# Altium footprint library 2.81-BGA132-152 NAND FLASH封装.PcbLib: 3 footprints
Each footprint in its own frame and in the unit in brackets; x right, y up, seen from the top. Pads: shape width x height; smd on the part's side, far side on the other; paste and mask are expansions set on the pad; w line width, h text height; cw(c..) or ccw(c..) is an arc to the next point about the centre after c.
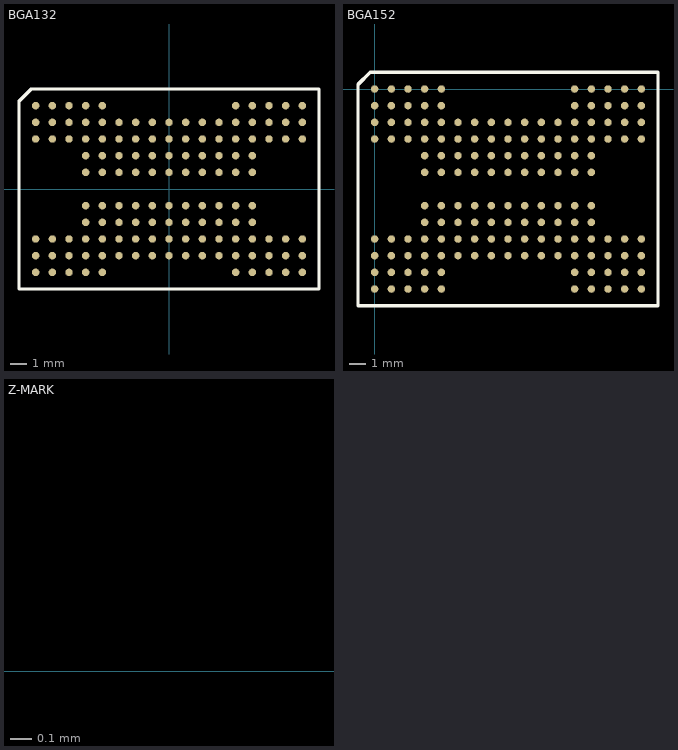
[diagram p0: the footprints below, top view; thin cyan lines are the x and y axes]

## BGA132 [mm] "封装库来自淘宝卖家 ID：黄晶宝石"
pads (132):
  round 0.45 smd: B1(-8,5) B2(-7,5) B3(-6,5) B4(-5,5) B5(-4,5) B13(4,5) B14(5,5) B15(6,5) B16(7,5) B17(8,5) C1(-8,4) C2(-7,4) C3(-6,4) C4(-5,4) C5(-4,4) C6(-3,4) C7(-2,4) C8(-1,4) C9(0,4) C10(1,4) C11(2,4) C12(3,4) C13(4,4) C14(5,4) C15(6,4) C16(7,4) C17(8,4) D1(-8,3) D2(-7,3) D3(-6,3) D4(-5,3) D5(-4,3) D6(-3,3) D7(-2,3) D8(-1,3) D9(0,3) D10(1,3) D11(2,3) D12(3,3) D13(4,3) D14(5,3) D15(6,3) D16(7,3) D17(8,3) E4(-5,2) E5(-4,2) E6(-3,2) E7(-2,2) E8(-1,2) E9(0,2) E10(1,2) E11(2,2) E12(3,2) E13(4,2) E14(5,2) F4(-5,1) F5(-4,1) F6(-3,1) F7(-2,1) F8(-1,1) F9(0,1) F10(1,1) F11(2,1) F12(3,1) F13(4,1) F14(5,1) H4(-5,-1) H5(-4,-1) H6(-3,-1) H7(-2,-1) H8(-1,-1) H9(0,-1) H10(1,-1) H11(2,-1) H12(3,-1) H13(4,-1) H14(5,-1) J4(-5,-2) J5(-4,-2) J6(-3,-2) J7(-2,-2) J8(-1,-2) J9(0,-2) J10(1,-2) J11(2,-2) J12(3,-2) J13(4,-2) J14(5,-2) K1(-8,-3) K2(-7,-3) K3(-6,-3) K4(-5,-3) K5(-4,-3) K6(-3,-3) K7(-2,-3) K8(-1,-3) K9(0,-3) K10(1,-3) K11(2,-3) K12(3,-3) K13(4,-3) K14(5,-3) K15(6,-3) K16(7,-3) K17(8,-3) L1(-8,-4) L2(-7,-4) L3(-6,-4) L4(-5,-4) L5(-4,-4) L6(-3,-4) L7(-2,-4) L8(-1,-4) L9(0,-4) L10(1,-4) L11(2,-4) L12(3,-4) L13(4,-4) L14(5,-4) L15(6,-4) L16(7,-4) L17(8,-4) M1(-8,-5) M2(-7,-5) M3(-6,-5) M4(-5,-5) M5(-4,-5) M13(4,-5) M14(5,-5) M15(6,-5) M16(7,-5) M17(8,-5)
Top Overlay:
  lines w0.2: 9,-6 -9,-6 -9,5.27 -8.27,6 9,6 ; 9,-5.969 9,5.969
3D body: height 0.8, standoff 0.3, extent -9.017,-5.969 9.017,5.969

## BGA152 [mm] "https://shop463601444.taobao.com"
pads (152):
  round 0.45 smd: A1(0,0) A2(1,0) A3(2,0) A4(3,0) A5(4,0) A13(12,0) A14(13,0) A15(14,0) A16(15,0) A17(16,0) B1(0,-1) B2(1,-1) B3(2,-1) B4(3,-1) B5(4,-1) B13(12,-1) B14(13,-1) B15(14,-1) B16(15,-1) B17(16,-1) C1(0,-2) C2(1,-2) C3(2,-2) C4(3,-2) C5(4,-2) C6(5,-2) C7(6,-2) C8(7,-2) C9(8,-2) C10(9,-2) C11(10,-2) C12(11,-2) C13(12,-2) C14(13,-2) C15(14,-2) C16(15,-2) C17(16,-2) D1(0,-3) D2(1,-3) D3(2,-3) D4(3,-3) D5(4,-3) D6(5,-3) D7(6,-3) D8(7,-3) D9(8,-3) D10(9,-3) D11(10,-3) D12(11,-3) D13(12,-3) D14(13,-3) D15(14,-3) D16(15,-3) D17(16,-3) E4(3,-4) E5(4,-4) E6(5,-4) E7(6,-4) E8(7,-4) E9(8,-4) E10(9,-4) E11(10,-4) E12(11,-4) E13(12,-4) E14(13,-4) F4(3,-5) F5(4,-5) F6(5,-5) F7(6,-5) F8(7,-5) F9(8,-5) F10(9,-5) F11(10,-5) F12(11,-5) F13(12,-5) F14(13,-5) H4(3,-7) H5(4,-7) H6(5,-7) H7(6,-7) H8(7,-7) H9(8,-7) H10(9,-7) H11(10,-7) H12(11,-7) H13(12,-7) H14(13,-7) J4(3,-8) J5(4,-8) J6(5,-8) J7(6,-8) J8(7,-8) J9(8,-8) J10(9,-8) J11(10,-8) J12(11,-8) J13(12,-8) J14(13,-8) K1(0,-9) K2(1,-9) K3(2,-9) K4(3,-9) K5(4,-9) K6(5,-9) K7(6,-9) K8(7,-9) K9(8,-9) K10(9,-9) K11(10,-9) K12(11,-9) K13(12,-9) K14(13,-9) K15(14,-9) K16(15,-9) K17(16,-9) L1(0,-10) L2(1,-10) L3(2,-10) L4(3,-10) L5(4,-10) L6(5,-10) L7(6,-10) L8(7,-10) L9(8,-10) L10(9,-10) L11(10,-10) L12(11,-10) L13(12,-10) L14(13,-10) L15(14,-10) L16(15,-10) L17(16,-10) M1(0,-11) M2(1,-11) M3(2,-11) M4(3,-11) M5(4,-11) M13(12,-11) M14(13,-11) M15(14,-11) M16(15,-11) M17(16,-11) N1(0,-12) N2(1,-12) N3(2,-12) N4(3,-12) N5(4,-12) N13(12,-12) N14(13,-12) N15(14,-12) N16(15,-12) N17(16,-12)
Top Overlay:
  lines w0.2: -1,-13 17,-13 17,1 -0.27,1 -1,0.27 -1,-13

## Z-MARK [mm]
Top Overlay:
  text "元件库封装库制作https://shop463601444.taobao.com" at -4.7,0.5 h0.7
  text "超低价原理图设计、PCB代画，布局合理，走线规范" at -4.5,-0.2 h0.7